# Altium footprint library Design III PCB Library.PcbLib: 98 footprints (part 5 of 7)
Each footprint in its own frame and in the unit in brackets; x right, y up, seen from the top. Pads: shape width x height; smd on the part's side, far side on the other; paste and mask are expansions set on the pad; w line width, h text height; cw(c..) or ccw(c..) is an arc to the next point about the centre after c.
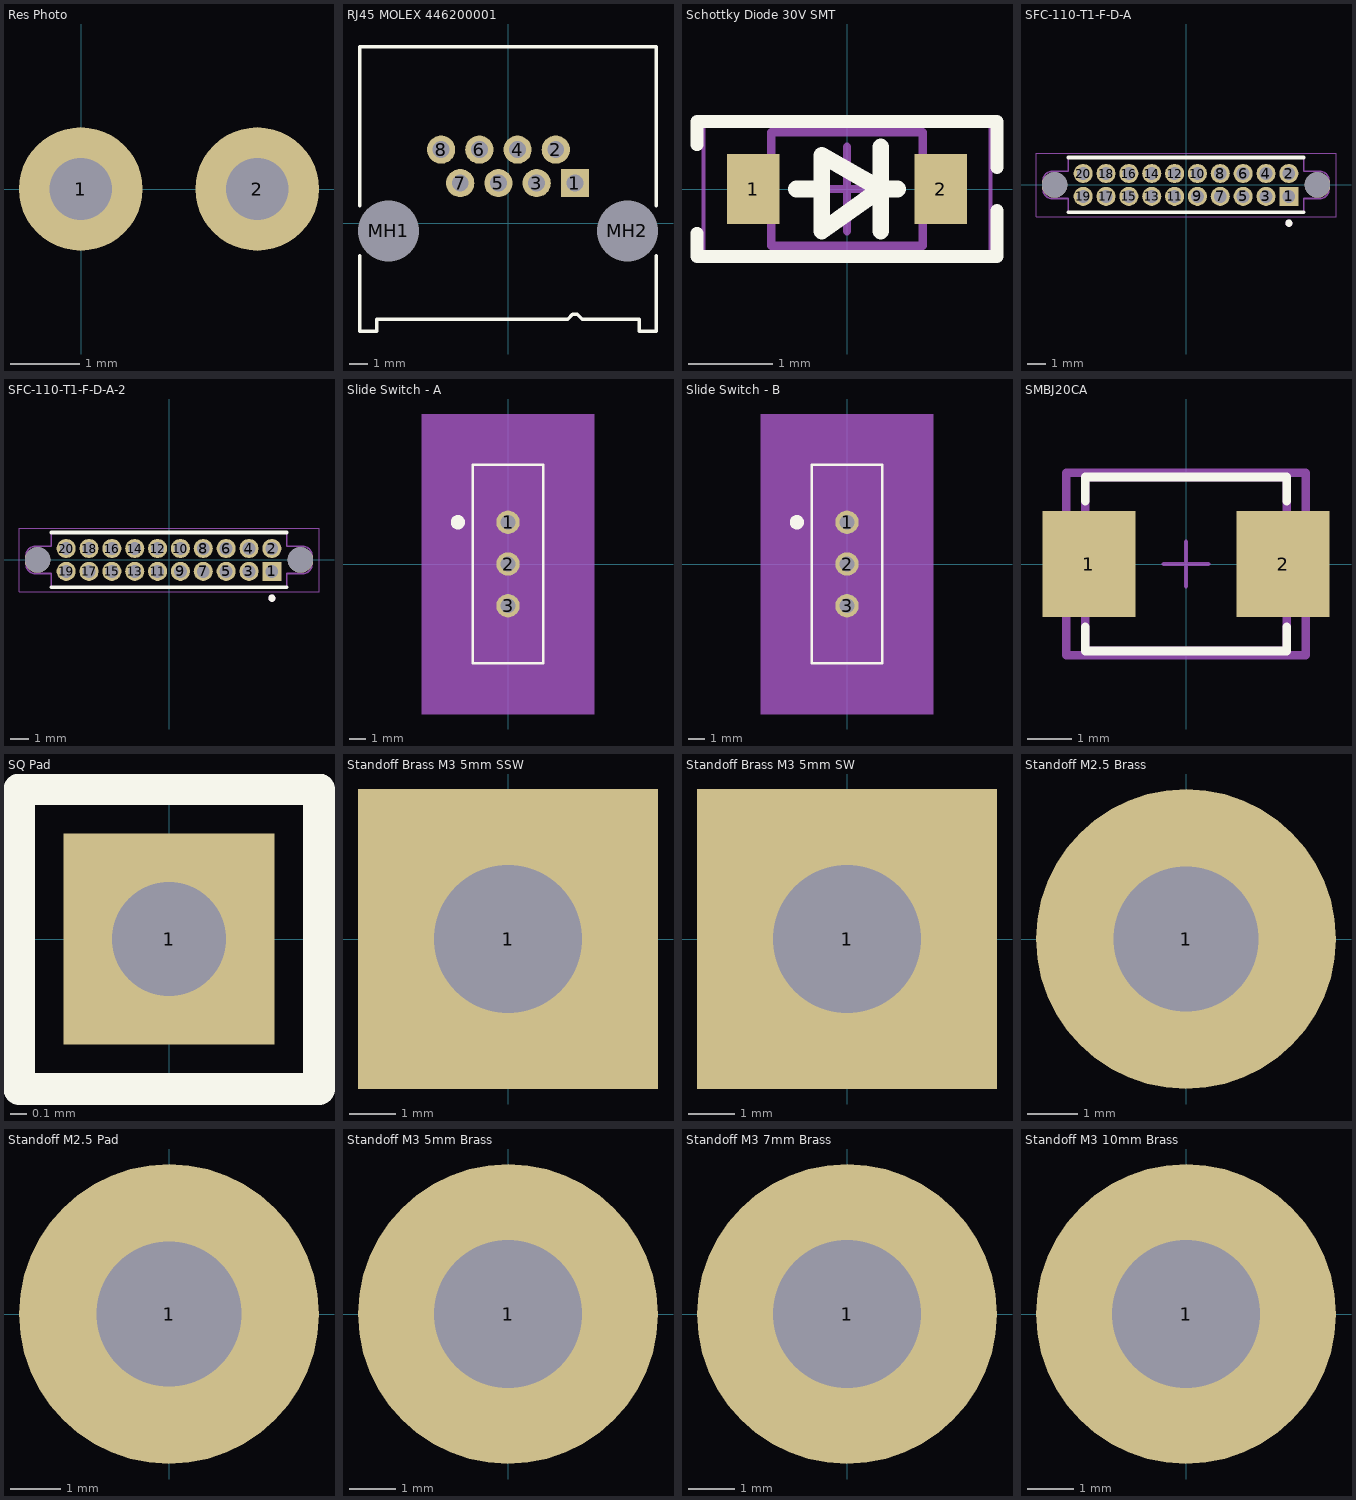
[diagram p4: the footprints below, top view; thin cyan lines are the x and y axes]

## Res Photo [mil] "Res Photo"
pads (2):
  round 70 hole 35.4: 1(-0.2,0.2) 2(99.8,0.2)
3D body: height 100, standoff -100, extent 82.8,-16.8 116.8,17.2
3D body: height 100, standoff -100, extent -17.2,-16.8 16.8,17.2
3D body: height 80, standoff 5, extent -40.1,-89.78 139.8,90.17
3D body: height 90, standoff 80, extent -38.1,-87.78 137.8,88.17

## RJ45 MOLEX 446200001 [mm] "RJ45 RA TH"
pads (10):
  rect 1.5x1.5 hole 0.9: 1(3.556,2.144)
  round 1.5 hole 0.9: 2(2.54,3.922) 3(1.524,2.144) 4(0.508,3.922) 5(-0.508,2.144) 6(-1.524,3.922) 7(-2.54,2.144) 8(-3.556,3.922)
  round 2.95 hole 3.25 unplated: MH1(-6.35,-0.396) MH2(6.35,-0.396)
Top Overlay:
  lines w0.178: -7.875,-1.728 -7.875,-5.726 -6.985,-5.726 -6.985,-5.091 3.175,-5.091 3.429,-4.837 3.683,-4.837 3.937,-5.091 6.985,-5.091 6.985,-5.726 7.875,-5.726 7.875,-1.728 ; -7.875,0.936 -7.875,9.384 7.875,9.384 7.875,0.936
3D body: height 13.21, standoff 0.25, extent -7.874,-5.599 7.874,9.387
3D body: height 11.18, standoff 2.9, extent -3.81,-5.726 3.81,-5.091
3D body: height 2.9, standoff 1.52, extent 3.302,-5.853 3.81,-5.726
3D body: height 12.19, standoff 2.9, extent -3.175,-5.726 3.175,-5.091
3D body: height 10.16, standoff 2.9, extent -6.985,-5.726 6.985,-5.091

## Schottky Diode 30V SMT [mm] "NSR0530HT1G"
pads (2):
  rect 0.625x0.83 smd: 1(-1.112,0) 2(1.112,0)
Top Overlay:
  lines w0.15: -1.778,-0.525 -1.778,-0.8 1.778,-0.8 1.778,-0.254 ; -1.778,0.525 -1.778,0.8 1.778,0.8 1.778,0.254
  lines w0.2: -0.6,0 -0.3,0 ; 0.4,-0.5 0.4,0.5 ; 0.6,0 0.4,0 ; 0.4,0 -0.3,-0.5 -0.3,0.4 0.4,0
Mechanical 13:
  lines w0.1: -0.9,-0.675 0.9,-0.675 0.9,0.675 -0.9,0.675 -0.9,-0.675
Mechanical 15:
  lines w0.05: -1.7,-0.85 1.7,-0.85 1.7,0.85 -1.7,0.85 -1.7,-0.85
  lines w0.1: -0.5,0 0.5,0 ; 0,-0.5 0,0.5
3D body "SOD-323.step": height 1.05, standoff 0, extent -1.36,-0.625 1.36,0.625

## SFC-110-T1-F-D-A [mm] "Headers & Wire Housings .050 Tiger Eye Cost-Effective Reliable Socket Strip"
pads (22):
  rect 1.06x1.06 hole 0.71: 1(5.715,-0.635)
  round 1.06 hole 0.71: 2(5.715,0.635) 3(4.445,-0.635) 4(4.445,0.635) 5(3.175,-0.635) 6(3.175,0.635) 7(1.905,-0.635) 8(1.905,0.635) 9(0.635,-0.635) 10(0.635,0.635) 11(-0.635,-0.635) 12(-0.635,0.635) 13(-1.905,-0.635) 14(-1.905,0.635) 15(-3.175,-0.635) 16(-3.175,0.635) 17(-4.445,-0.635) 18(-4.445,0.635) 19(-5.715,-0.635) 20(-5.715,0.635)
  round 1.42 hole 1.42 unplated: ""(-7.305,0) ""(7.305,0)
Top Overlay:
  circle w0.2: c5.715,-2.125 r0.1
  lines w0.2: -6.54,-1.525 6.54,-1.525 ; -6.54,1.525 6.54,1.525
Mechanical 13:
  circle w0.2: c5.715,-2.125 r0.1
  lines w0.1: -7.94,-0.25 ccw(c-7.43,-0.25) -7.43,-0.76 -6.54,-0.76 -6.54,-1.525 6.54,-1.525 6.54,-0.76 7.43,-0.76 ccw(c7.43,-0.25) 7.94,-0.25 7.94,0.25 ccw(c7.43,0.25) 7.43,0.76 6.54,0.76 6.54,1.525 -6.54,1.525 -6.54,0.76 -7.43,0.76 ccw(c-7.43,0.25) -7.94,0.25 -7.94,-0.25
Mechanical 15:
  lines w0.05: -8.335,-1.775 8.335,-1.775 8.335,1.775 -8.335,1.775 -8.335,-1.775

## SFC-110-T1-F-D-A-2 [mm] "Headers & Wire Housings .050 Tiger Eye Cost-Effective Reliable Socket Strip"
pads (22):
  rect 1.06x1.06 hole 0.71: 1(5.715,-0.635)
  round 1.06 hole 0.71: 2(5.715,0.635) 3(4.445,-0.635) 4(4.445,0.635) 5(3.175,-0.635) 6(3.175,0.635) 7(1.905,-0.635) 8(1.905,0.635) 9(0.635,-0.635) 10(0.635,0.635) 11(-0.635,-0.635) 12(-0.635,0.635) 13(-1.905,-0.635) 14(-1.905,0.635) 15(-3.175,-0.635) 16(-3.175,0.635) 17(-4.445,-0.635) 18(-4.445,0.635) 19(-5.715,-0.635) 20(-5.715,0.635)
  round 1.42 hole 1.42 unplated: ""(-7.305,0) ""(7.305,0)
Top Overlay:
  circle w0.2: c5.715,-2.125 r0.1
  lines w0.2: -6.54,-1.525 6.54,-1.525 ; -6.54,1.525 6.54,1.525
Mechanical 13:
  circle w0.2: c5.715,-2.125 r0.1
  lines w0.1: -7.94,-0.25 ccw(c-7.43,-0.25) -7.43,-0.76 -6.54,-0.76 -6.54,-1.525 6.54,-1.525 6.54,-0.76 7.43,-0.76 ccw(c7.43,-0.25) 7.94,-0.25 7.94,0.25 ccw(c7.43,0.25) 7.43,0.76 6.54,0.76 6.54,1.525 -6.54,1.525 -6.54,0.76 -7.43,0.76 ccw(c-7.43,0.25) -7.94,0.25 -7.94,-0.25
Mechanical 15:
  lines w0.05: -8.335,-1.775 -8.335,1.775 8.335,1.775 8.335,-1.775 -8.335,-1.775
3D body "SFC-110-T1-F-D-A.stp": height 4.57, standoff -3.05, extent -7.938,-1.524 7.938,2.159

## Slide Switch - A [mil] "Slide Switch SPDT Through Hole"
pads (3):
  round 55 hole 35 mask+0: 1(0,98.43) 2(0,0) 3(0,-98.43)
Top Overlay:
  circle w17.72: c-118.11,98.43 r7.87
  lines w6: -83.5,-233.5 83.5,-233.5 83.5,233.5 -83.5,233.5 -83.5,-233.5
Mechanical 5:
  region: 203.5,-353.5 -203.5,-353.5 -203.5,353.5 203.5,353.5
Mechanical 13:
  region: 39.5,-78.5 -39.5,-78.5 -39.5,0 39.5,0
  lines w1: -78.5,-228.5 78.5,-228.5 78.5,228.5 -78.5,228.5 -78.5,-228.5 ; -39.5,-78.5 -39.5,78.5 39.5,78.5 39.5,-78.5 -39.5,-78.5
Mechanical 15:
  region: 88.5,-238.5 -88.5,-238.5 -88.5,238.5 88.5,238.5
  lines w6: -88.5,-238.5 88.5,-238.5 88.5,238.5 -88.5,238.5 -88.5,-238.5
3D body: height 10, standoff 0, extent 0,98.43 10,108.43
3D body "EG1218.stp": height 291.34, standoff -185.04, extent -78.74,-228.35 78.74,228.35

## Slide Switch - B [mil] "Slide Switch SPDT Through Hole"
pads (3):
  round 55 hole 35 mask+0: 1(0,99.41) 2(0,0.98) 3(0,-97.44)
Top Overlay:
  circle w17.72: c-118.11,99.41 r7.87
  lines w6: -83.5,-232.52 -83.5,234.48 83.5,234.48 83.5,-232.52 -83.5,-232.52
Mechanical 5:
  region: 203.5,-352.52 -203.5,-352.52 -203.5,354.48 203.5,354.48
Mechanical 13:
  region: 39.5,-77.52 -39.5,-77.52 -39.5,0.98 39.5,0.98
  lines w1: -78.5,-227.52 -78.5,229.48 78.5,229.48 78.5,-227.52 -78.5,-227.52 ; -39.5,-77.52 39.5,-77.52 39.5,79.48 -39.5,79.48 -39.5,-77.52
Mechanical 15:
  region: 88.5,-237.52 -88.5,-237.52 -88.5,239.48 88.5,239.48
  lines w6: -88.5,-237.52 -88.5,239.48 88.5,239.48 88.5,-237.52 -88.5,-237.52
3D body "EG1218.stp": height 291.34, standoff -185.04, extent -78.74,-227.36 78.74,229.33
3D body: height 10, standoff 0, extent 0,99.41 10,109.41

## SMBJ20CA [mm] "32.4V Clamp 18.6A Ipp Tvs Diode Surface Mount SMB (DO-214AA)"
pads (2):
  rect 2.1x2.4 smd paste+0 mask+0: 1(-2.2,0) 2(2.2,0)
Top Overlay:
  lines w0.2: -2.285,-1.425 -2.285,-1.97 2.285,-1.97 2.285,-1.425 ; -2.285,1.425 -2.285,1.97 2.285,1.97 2.285,1.425
Mechanical 5:
  lines w0.2: -2.715,-2.07 2.715,-2.07 2.715,2.07 -2.715,2.07 -2.715,-2.07
Mechanical 13:
  lines w0.2: -2.285,-1.97 2.285,-1.97 2.285,1.97 -2.285,1.97 -2.285,-1.97
Mechanical 15:
  lines w0.2: -2.715,-2.07 2.715,-2.07 2.715,2.07 -2.715,2.07 -2.715,-2.07
Top Component Center:
  lines w0.1: -0.5,0 0.5,0 ; 0,-0.5 0,0.5
3D body "Diode_Bourns_Inc_SMBJ20CA_eec.STEP": height 0.25, standoff 0, extent -2.715,-2.07 2.715,2.07

## SQ Pad [mm] "Pad"
pads (1):
  rect 1.3x1.3 hole 0.7: 1(0,0)
Top Overlay:
  lines w0.2: -0.925,-0.925 0.925,-0.925 0.925,0.925 -0.925,0.925 -0.925,-0.925
Bottom Overlay:
  lines w0.2: -0.925,-0.925 0.925,-0.925 0.925,0.925 -0.925,0.925 -0.925,-0.925

## Standoff Brass M3 5mm SSW [mm]
pads (1):
  rect 6.5x6.5 hole 3.2: 1(0,0)
3D body "Wurth M3 Hex 5mm Brass.STEP": height -0.4, standoff -13.4, extent -2.5,-2.887 2.5,2.887
3D body "keystone-PN9923-2.STEP": height 3.55, standoff -4.55, extent -3.2,-3.2 3.2,3.2

## Standoff Brass M3 5mm SW [mm]
pads (1):
  rect 6.5x6.5 hole 3.2: 1(0,0)
3D body "Wurth M3 Hex 5mm Brass.STEP": height -0.4, standoff -13.4, extent -2.5,-2.887 2.5,2.887

## Standoff M2.5 Brass [mm] "Hex Standoff Threaded M2.5 Brass 0.197\" (5.00mm) Silver"
pads (1):
  round 6 hole 2.9: 1(0,0)
3D body "Wurth M2.5 Hex 5mm.STEP": height 5, standoff -6, extent -2.5,-2.887 2.5,2.887

## Standoff M2.5 Pad [mm] "Hex Standoff Threaded M2.5 Brass 0.197\""
pads (1):
  round 6 hole 2.9: 1(0,0)

## Standoff M3 5mm Brass [mm] "Hex Standoff Threaded M3 Brass 0.197\" (5.00mm) Silver"
pads (1):
  round 6.5 hole 3.2: 1(0,0)
3D body "Wurth M3 Hex 5mm Brass.STEP": height -0.4, standoff -13.4, extent -2.5,-2.887 2.5,2.887

## Standoff M3 7mm Brass [mm] "Hex Standoff Threaded M3x0.5 Brass 0.276\" (7.00mm)"
pads (1):
  round 6.5 hole 3.2: 1(0,0)
3D body "r30-3000702.STEP": height -0.4, standoff -13.4, extent -2.5,-2.887 2.5,2.887

## Standoff M3 10mm Brass [mm] "Hex Standoff Threaded M3 Aluminum 0.394\" (10.00mm)"
pads (1):
  round 6.5 hole 3.2: 1(0,0)
3D body "Download_STEP_971100324 (rev1).STEP": height 10, standoff -6, extent -2.75,-3.175 2.75,3.175